# Altium footprint library 方林 封装库.PcbLib: 101 footprints (part 2 of 7)
Each footprint in its own frame and in the unit in brackets; x right, y up, seen from the top. Pads: shape width x height; smd on the part's side, far side on the other; paste and mask are expansions set on the pad; w line width, h text height; cw(c..) or ccw(c..) is an arc to the next point about the centre after c.
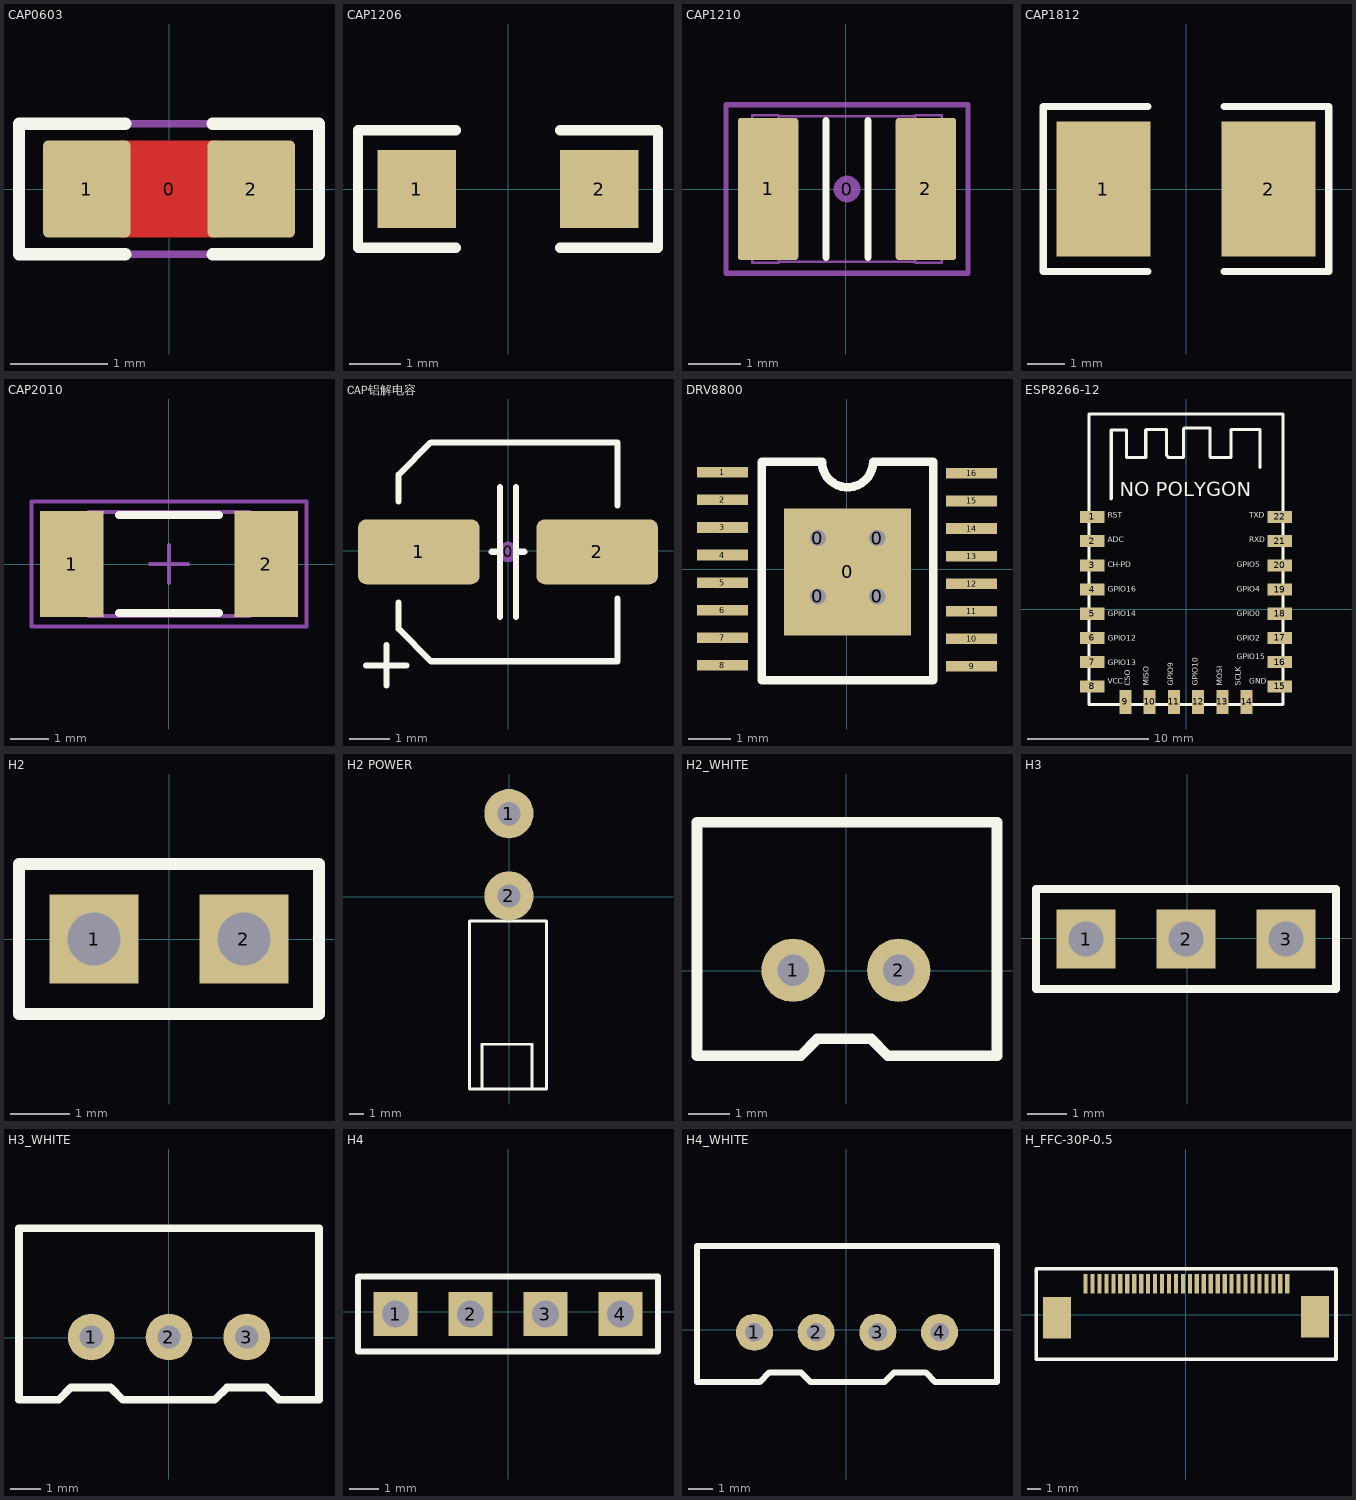
[diagram p1: the footprints below, top view; thin cyan lines are the x and y axes]

## CAP0603 [mm]
pads (3):
  round 0.254 on Mech14: 0(0,0)
  rrect10% 0.9x1 smd: 1(-0.85,0) 2(0.85,0)
Top Layer:
  pour cut-out: -0.5,0.5 0.5,0.5 0.5,-0.5 -0.5,-0.5
Top Overlay:
  lines w0.127: -0.45,-0.675 -1.55,-0.675 -1.55,0.675 -0.45,0.675 ; 0.45,-0.675 1.55,-0.675 1.55,0.675 0.45,0.675
Mechanical 13:
  lines w0.05: -0.6,-0.4 -0.6,0.399 0.6,0.4 0.6,-0.4 -0.6,-0.399 ; -0.505,-0.398 -0.505,0.398 ; -0.5,-0.4 -0.8,-0.4 -0.8,0.4 -0.5,0.4 ; 0.5,-0.4 0.8,-0.4 0.8,0.4 0.5,0.4 ; 0.505,-0.398 0.505,0.398 ; -0.599,-0.398 -0.599,0.398 0.599,0.398 0.599,-0.398 -0.599,-0.398
Mechanical 14:
  lines w0.076: -1.55,-0.675 1.55,-0.675 1.55,0.675 -1.55,0.675 -1.55,-0.675
3D body "CAP_0603.STEP": height 0.89, standoff -0.01, extent -0.85,-0.45 0.85,0.45

## CAP1206 [mil]
pads (2):
  rect 60x60 smd: 1(-70,0) 2(70,0)
Top Overlay:
  lines w7.87: -40,-45 -115,-45 -115,45 -40,45 ; 40,-45 115,-45 115,45 40,45
3D body: height 39.37, standoff 0, extent -75,-35 -55,35
3D body: height 39.37, standoff 0, extent 55,-35 75,35
3D body: height 39.37, standoff 0, extent -55,-35 55,35

## CAP1210 [mm]
pads (3):
  round 0.508 on Mech14: 0(0.025,0)
  rrect10% 1.15x2.7 smd: 1(-1.475,0) 2(1.525,0)
Top Overlay:
  lines w0.127: -0.375,-1.3 -0.375,1.3 ; 0.425,-1.3 0.425,1.3
Mechanical 13:
  lines w0.05: -1.275,-1.38 1.325,-1.38 ; -1.275,1.38 1.325,1.38 ; -1.775,-1.4 -1.775,1.4 -1.275,1.4 -1.275,-1.4 -1.775,-1.4 ; 1.325,-1.4 1.825,-1.4 1.825,1.4 1.325,1.4 1.325,-1.4
Mechanical 14:
  lines w0.1: -2.275,-1.6 2.325,-1.6 2.325,1.6 -2.275,1.6 -2.275,-1.6
3D body "CAP_1210.STEP": height 2.19, standoff -0.01, extent -1.774,-1.4 1.826,1.4

## CAP1812 [mm]
pads (2):
  rect 2.5x3.6 smd: 1(-2.2,0) 2(2.2,0)
Top Overlay:
  lines w0.2: -1.016,-2.2 -3.81,-2.2 -3.81,2.2 -1.016,2.2 ; 1.016,-2.2 3.81,-2.2 3.81,2.2 1.016,2.2
3D body: height 0.9, standoff 0, extent -2.54,0.635 -2.032,1.524
3D body: height 0.9, standoff 0, extent -2.54,-1.524 -2.032,-0.635
3D body: height 0.9, standoff 0, extent 2.159,-1.524 2.667,-0.635
3D body: height 0.9, standoff 0, extent 2.159,0.635 2.667,1.524
3D body: height 1.2, standoff 0, extent -2.286,-1.651 2.286,1.651

## CAP2010 [mm]
pads (2):
  rect 1.65x2.75 smd: 1(-2.525,0) 2(2.525,0)
Top Overlay:
  lines w0.2: -1.3,-1.275 1.3,-1.275 ; -1.3,1.275 1.3,1.275
Mechanical 13:
  lines w0.1: -2.1,-1.35 -2.1,1.35 2.1,1.35 2.1,-1.35 -2.1,-1.35
Mechanical 15:
  lines w0.1: -0.5,0 0.5,0 ; 0,-0.5 0,0.5 ; -3.575,-1.625 -3.575,1.625 3.575,1.625 3.575,-1.625 -3.575,-1.625
3D body: height 0.6, standoff 0, extent -2.1,-1.35 2.1,1.35

## CAP铝解电容 [mm]
pads (3):
  round 0.508 on Mech14: 0(0,-0.025)
  rrect25% 3x1.6 smd: 1(-2.2,-0.025) 2(2.2,-0.025)
Top Overlay:
  lines w0.152: -3.5,-2.825 -3,-2.825 -2.5,-2.825 ; -3,-3.325 -3,-2.325 ; -2.7,-1.275 -2.7,-1.925 -1.9,-2.725 2.7,-2.725 2.7,-1.175 ; -2.7,1.225 -2.7,1.875 -1.9,2.675 2.7,2.675 2.7,1.125 ; -0.4,-0.025 -0.2,-0.025 ; -0.2,-1.625 -0.2,1.575 ; 0.2,-1.625 0.2,1.575 ; 0.2,-0.025 0.4,-0.025
3D body "Cap, elec, 5x5.7_.STEP": height 5.7, standoff 0, extent -2.65,-2.675 2.65,2.624

## DRV8800 [mm]
pads (21):
  round 0.762 hole 0.381: 0(-0.687,0.738) 0(-0.687,-0.637) 0(0.712,-0.637) 0(0.712,0.738)
  rect 3x3 smd: 0(0.013,-0.062)
  rect 1.2x0.25 smd: 1(-2.937,2.287) 2(-2.937,1.637) 3(-2.937,0.988) 4(-2.938,0.338) 5(-2.937,-0.312) 6(-2.938,-0.962) 7(-2.937,-1.613) 8(-2.938,-2.262) 9(2.937,-2.287) 10(2.938,-1.637) 11(2.938,-0.987) 12(2.937,-0.337) 13(2.937,0.313) 14(2.938,0.963) 15(2.937,1.613) 16(2.938,2.263)
Top Overlay:
  lines w0.203: -2.014,-2.612 2.036,-2.612 2.036,2.538 0.615,2.538 cw(c0.013,2.538) -0.59,2.538 -2.014,2.538 -2.014,-2.612
3D body: height 0.76, standoff 0, extent -2.022,-2.635 2.042,2.546

## ESP8266-12 [mm]
pads (22):
  rect 2x1 smd: 1(-7.747,7.64) 2(-7.747,5.64) 3(-7.747,3.64) 4(-7.747,1.64) 5(-7.747,-0.36) 6(-7.747,-2.36) 7(-7.747,-4.36) 8(-7.747,-6.36) 15(7.747,-6.36) 16(7.747,-4.36) 17(7.747,-2.36) 18(7.747,-0.36) 19(7.747,1.64) 20(7.747,3.64) 21(7.747,5.64) 22(7.747,7.64)
  rect 1x2 smd: 9(-5.001,-7.64) 10(-3.001,-7.64) 11(-1.001,-7.64) 12(0.999,-7.64) 13(2.999,-7.64) 14(4.999,-7.64)
Top Overlay:
  lines w0.254: -7.747,-6.36 -7.029,-6.36 ; -6.198,9.127 -6.172,9.153 -6.172,14.817 -4.902,14.817 -4.902,12.531 -3.327,12.531 -3.327,14.817 -3.277,14.868 -1.6,14.868 -1.6,12.709 -1.422,12.531 -0.203,12.531 -0.203,14.918 -0.127,14.995 1.981,14.995 1.981,12.582 2.032,12.531 3.734,12.531 3.734,14.868 6.121,14.868 6.121,11.718 ; -8.001,-7.84 -8.001,16.14 7.999,16.14 7.999,-7.84 -8.001,-7.84
  text "GPIO5" at 4.191,3.336 h0.76
  text "GPIO4" at 4.191,1.304 h0.76
  text "GPIO0" at 4.191,-0.728 h0.76
  text "GPIO2" at 4.191,-2.76 h0.76
  text "GPIO15" at 4.191,-4.284 h0.76
  text "GPIO10" at 1.143,-6.316 h0.76
  text "GPIO9" at -0.889,-6.316 h0.76
  text "ADC" at -6.477,5.368 h0.76
  text "CH-PD" at -6.477,3.336 h0.76
  text "GPIO16" at -6.477,1.304 h0.76
  text "GPIO14" at -6.477,-0.728 h0.76
  text "GPIO12" at -6.477,-2.76 h0.76
  text "GPIO13" at -6.452,-4.792 h0.76
  text "CSO" at -4.445,-6.316 h0.76
  text "MISO" at -2.921,-6.316 h0.76
  text "MOSI" at 3.175,-6.316 h0.76
  text "SCLK" at 4.699,-6.316 h0.76
  text "NO POLYGON" at -5.461,8.924 h2
  text "RST" at -6.477,7.4 h0.76
  text "VCC" at -6.477,-6.316 h0.76
  text "GND" at 5.207,-6.316 h0.76
  text "TXD" at 5.207,7.4 h0.76
  text "RXD" at 5.207,5.368 h0.76
3D body: height 0.76, standoff 0, extent -8.128,-8.094 8.128,16.29

## H2 [mm] "排针"
pads (2):
  rect 1.5x1.5 hole 0.9: 1(-1.27,0) 2(1.27,0)
Top Overlay:
  lines w0.2: -2.54,-1.27 2.54,-1.27 2.54,1.27 -2.54,1.27 -2.54,-1.27
3D body "HEADER.STEP": height 7.58, standoff -2.94, extent -2.54,-1.27 0,1.27
3D body "HEADER.STEP": height 7.58, standoff -2.94, extent 0,-1.27 2.54,1.27

## H2 POWER [mm]
pads (2):
  round 3.5 hole 1.65: 1(-0.025,5.918) 2(-0.025,0.076)
Top Overlay:
  lines w0.2: -1.93,-13.513 -1.93,-10.465 1.626,-10.465 1.626,-13.64 ; -2.819,-13.64 -2.819,-1.702 1.221,-1.702 2.642,-1.702 2.642,-13.64 -2.819,-13.64
3D body "026013114.stp": height 11.4, standoff -3.6, extent -2.692,-13.574 3.108,6.361

## H2_WHITE [mil] "小白头"
pads (2):
  round 60 hole 30: 1(-50.13,0.56) 2(49.87,0.56)
Top Overlay:
  lines w10: -141.13,-80.18 -141.13,140.56 142.87,140.56 142.87,-80.18 80.87,-80.18 39.62,-80.18 23.88,-64.44 -27.14,-64.44 -42.88,-80.18 -141.13,-80.18

## H3 [mm] "排针"
pads (3):
  rect 1.5x1.5 hole 0.9: 1(-2.565,-0.025) 2(-0.025,-0.025) 3(2.515,-0.025)
Top Overlay:
  lines w0.2: -3.835,-1.295 3.785,-1.295 3.785,1.245 -3.835,1.245 -3.835,-1.295
3D body "HEADER.STEP": height 7.58, standoff -2.94, extent -3.835,-1.295 -1.295,1.245
3D body "HEADER.STEP": height 7.58, standoff -2.94, extent -1.295,-1.295 1.245,1.245
3D body "HEADER.STEP": height 7.58, standoff -2.94, extent 1.245,-1.295 3.785,1.245

## H3_WHITE [mil] "小白头"
pads (3):
  round 60 hole 30: 1(-99.97,0.86) 2(0.03,0.86) 3(100.03,0.86)
Top Overlay:
  lines w10: -192.97,-79.88 -192.97,140.86 193.03,140.86 193.03,-79.88 141.53,-79.88 125.79,-64.14 74.77,-64.14 59.03,-79.88 -59.47,-79.88 -75.21,-64.14 -126.23,-64.14 -141.97,-79.88 -192.97,-79.88

## H4 [mm] "排针"
pads (4):
  rect 1.5x1.5 hole 0.9: 1(-3.81,-0.076) 2(-1.27,-0.076) 3(1.27,-0.076) 4(3.81,-0.076)
Top Overlay:
  lines w0.2: -5.08,-1.346 -5.08,1.194 5.08,1.194 5.08,-1.346 -5.08,-1.346
3D body "HEADER.STEP": height 7.58, standoff -2.94, extent 2.54,-1.346 5.08,1.194
3D body "HEADER.STEP": height 7.58, standoff -2.94, extent 0,-1.346 2.54,1.194
3D body "HEADER.STEP": height 7.58, standoff -2.94, extent -2.54,-1.346 0,1.194
3D body "HEADER.STEP": height 7.58, standoff -2.94, extent -5.08,-1.346 -2.54,1.194

## H4_WHITE [mil] "小白头"
pads (4):
  round 60 hole 30: 1(-148.75,-4.15) 2(-48.75,-4.15) 3(51.25,-4.15) 4(151.25,-4.15)
Top Overlay:
  lines w10: -241.75,-84.89 -140.25,-84.89 -124.51,-69.15 -73.49,-69.15 -57.75,-84.89 61.75,-84.89 77.49,-69.15 128.51,-69.15 144.25,-84.89 244.25,-84.89 244.25,135.85 -241.75,135.85 -241.75,-84.89

## H_FFC-30P-0.5 [mm]
height 1.45
pads (32):
  rect 0.3x1.4 smd: 1(-7.221,2.219) 2(-6.721,2.219) 3(-6.221,2.219) 4(-5.721,2.219) 5(-5.221,2.219) 6(-4.721,2.219) 7(-4.221,2.219) 8(-3.721,2.219) 9(-3.221,2.219) 10(-2.721,2.219) 11(-2.221,2.219) 12(-1.721,2.219) 13(-1.221,2.219) 14(-0.721,2.219) 15(-0.221,2.219) 16(0.279,2.219) 17(0.779,2.219) 18(1.279,2.219) 19(1.779,2.219) 20(2.279,2.219) 21(2.779,2.219) 22(3.279,2.219) 23(3.779,2.219) 24(4.279,2.219) 25(4.779,2.219) 26(5.279,2.219) 27(5.779,2.219) 28(6.279,2.219) 29(6.779,2.219) 30(7.279,2.219)
  rect 2x3 smd: ""(-9.279,-0.219) ""(9.279,-0.154)
Top Overlay:
  lines w0.254: -10.777,-3.216 10.779,-3.216 10.779,3.311 -10.777,3.311 -10.777,-3.216